# Altium footprint library RES_TH.PcbLib: 104 footprints (part 7 of 7)
Each footprint in its own frame and in the unit in brackets; x right, y up, seen from the top. Pads: shape width x height; smd on the part's side, far side on the other; paste and mask are expansions set on the pad; w line width, h text height; cw(c..) or ccw(c..) is an arc to the next point about the centre after c.
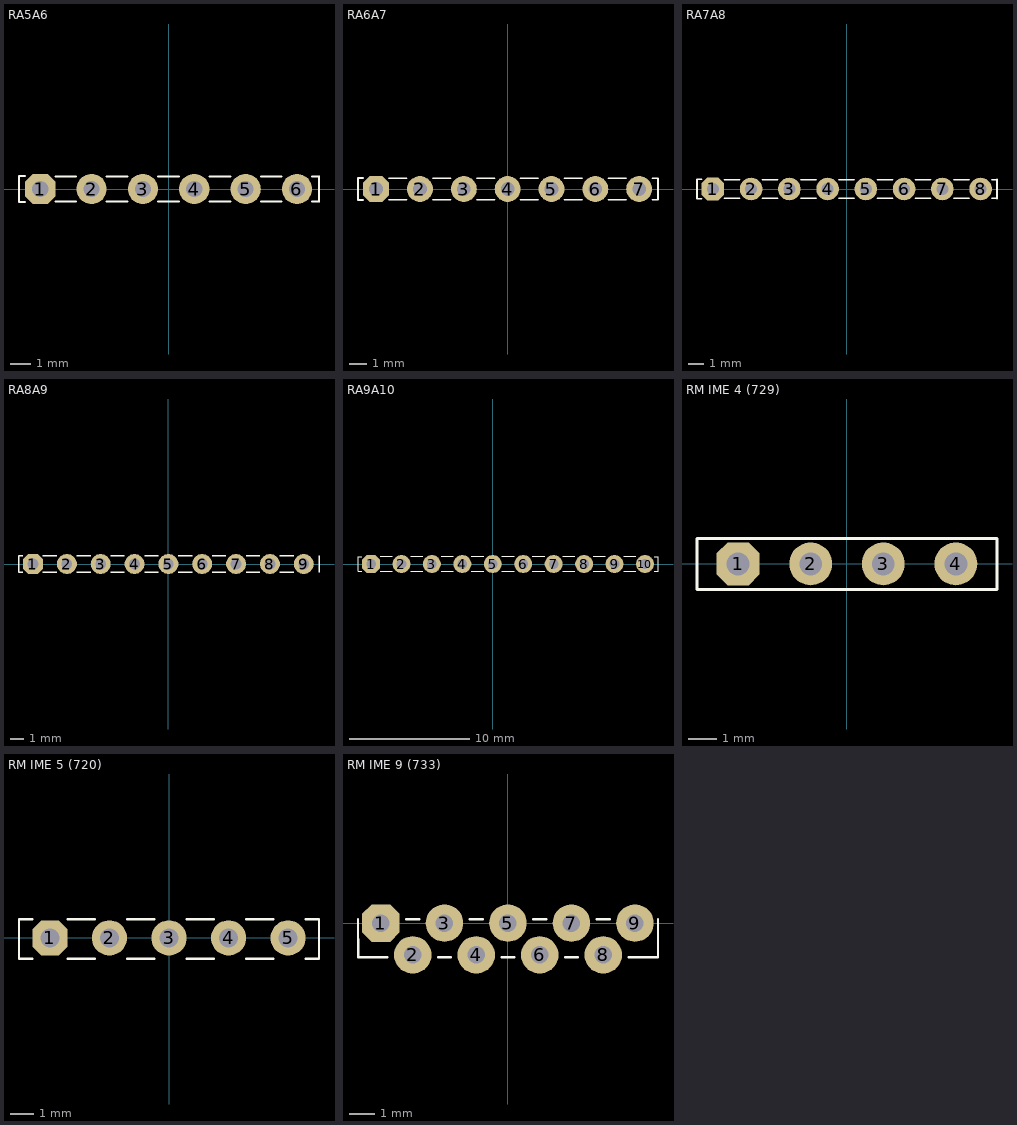
[diagram p6: the footprints below, top view; thin cyan lines are the x and y axes]

## RA5A6 [mm]
pads (6):
  oct 1.5x1.5 hole 0.8: 1(-6.35,0)
  round 1.5 hole 0.8: 2(-3.81,0) 3(-1.27,0) 4(1.27,0) 5(3.81,0) 6(6.35,0)
Top Overlay:
  lines w0.1: -7.1,-0.635 -7.4,-0.635 -7.4,0.635 -7.1,0.635 ; -5.6,-0.625 -4.57,-0.625 ; -5.6,0.625 -4.57,0.625 ; -3.06,-0.625 -2.03,-0.625 ; -3.06,0.625 -2.03,0.625 ; -0.52,-0.625 0.51,-0.625 ; -0.52,0.625 0.51,0.625 ; 2.02,-0.625 3.05,-0.625 ; 2.02,0.625 3.05,0.625 ; 4.56,-0.625 5.59,-0.625 ; 4.56,0.625 5.59,0.625 ; 7.1,-0.625 7.44,-0.625 ; 7.1,0.625 7.44,0.625 ; 7.44,-0.625 7.44,0.625 ; 7.44,-0.625 7.44,-0.625 ; 7.44,0.625 7.44,0.625
3D body "RM-6.SLDPRT": height 5.3, standoff -3.2, extent -7.4,-0.625 7.44,0.625

## RA6A7 [mm]
pads (7):
  oct 1.5x1.5 hole 0.8: 1(-7.62,0)
  round 1.5 hole 0.8: 2(-5.08,0) 3(-2.54,0) 4(0,0) 5(2.54,0) 6(5.08,0) 7(7.62,0)
Top Overlay:
  lines w0.1: -8.37,-0.635 -8.67,-0.635 -8.67,0.635 -8.37,0.635 ; -6.87,-0.625 -5.84,-0.625 ; -6.87,0.625 -5.84,0.625 ; -4.33,-0.625 -3.3,-0.625 ; -4.33,0.625 -3.3,0.625 ; -1.79,-0.625 -0.76,-0.625 ; -1.79,0.625 -0.76,0.625 ; 0.75,-0.625 1.78,-0.625 ; 0.75,0.625 1.78,0.625 ; 3.29,-0.625 4.32,-0.625 ; 3.29,0.625 4.32,0.625 ; 5.83,-0.625 6.86,-0.625 ; 5.83,0.625 6.86,0.625 ; 8.37,-0.625 8.71,-0.625 8.71,0.625 8.37,0.625
3D body "RM-7.SLDPRT": height 5.3, standoff -3.2, extent -8.67,-0.625 8.71,0.625

## RA7A8 [mm]
pads (8):
  oct 1.5x1.5 hole 0.8: 1(-8.89,0)
  round 1.5 hole 0.8: 2(-6.35,0) 3(-3.81,0) 4(-1.27,0) 5(1.27,0) 6(3.81,0) 7(6.35,0) 8(8.89,0)
Top Overlay:
  lines w0.1: -9.64,-0.635 -9.94,-0.635 -9.94,0.635 -9.64,0.635 ; -8.14,-0.625 -7.11,-0.625 ; -8.14,0.625 -7.11,0.625 ; -5.6,-0.625 -4.57,-0.625 ; -5.6,0.625 -4.57,0.625 ; -3.06,-0.625 -2.03,-0.625 ; -3.06,0.625 -2.03,0.625 ; -0.52,-0.625 0.51,-0.625 ; -0.52,0.625 0.51,0.625 ; 2.02,-0.625 3.05,-0.625 ; 2.02,0.625 3.05,0.625 ; 4.56,-0.625 5.59,-0.625 ; 4.56,0.625 5.59,0.625 ; 7.1,-0.625 8.13,-0.625 ; 7.1,0.625 8.13,0.625 ; 9.64,-0.625 9.98,-0.625 ; 9.64,0.625 9.98,0.625 ; 9.98,-0.635 9.98,0.635
3D body "RM-8.SLDPRT": height 6.3, standoff -2.2, extent -9.94,-0.625 9.98,0.625

## RA8A9 [mm]
pads (9):
  oct 1.5x1.5 hole 0.8: 1(-10.16,0)
  round 1.5 hole 0.8: 2(-7.62,0) 3(-5.08,0) 4(-2.54,0) 5(0,0) 6(2.54,0) 7(5.08,0) 8(7.62,0) 9(10.16,0)
Top Overlay:
  lines w0.1: -10.91,-0.635 -11.21,-0.635 -11.21,0.635 -10.91,0.635 ; -9.41,-0.625 -8.38,-0.625 ; -9.41,0.625 -8.38,0.625 ; -6.87,-0.625 -5.84,-0.625 ; -6.87,0.625 -5.84,0.625 ; -4.33,-0.625 -3.3,-0.625 ; -4.33,0.625 -3.3,0.625 ; -1.79,-0.625 -0.76,-0.625 ; -1.79,0.625 -0.76,0.625 ; 0.75,-0.625 1.78,-0.625 ; 0.75,0.625 1.78,0.625 ; 3.29,-0.625 4.32,-0.625 ; 3.29,0.625 4.32,0.625 ; 5.83,-0.625 6.86,-0.625 ; 5.83,0.625 6.86,0.625 ; 8.37,-0.625 9.4,-0.625 ; 8.37,0.625 9.4,0.625 ; 11.303,-0.635 11.303,0.635
3D body "RM-9.SLDPRT": height 6.3, standoff -2.2, extent -11.21,-0.625 11.25,0.625

## RA9A10 [mm]
pads (10):
  oct 1.5x1.5 hole 0.8: 1(-10.16,0)
  round 1.5 hole 0.8: 2(-7.62,0) 3(-5.08,0) 4(-2.54,0) 5(0,0) 6(2.54,0) 7(5.08,0) 8(7.62,0) 9(10.16,0) 10(12.7,0)
Top Overlay:
  lines w0.1: -10.922,-0.625 -11.25,-0.625 -11.25,0.625 -10.922,0.625 ; -9.398,-0.625 -8.382,-0.625 ; -9.398,0.635 -8.382,0.635 ; -6.858,-0.625 -5.842,-0.625 ; -6.858,0.635 -5.842,0.635 ; -4.318,-0.625 -3.302,-0.625 ; -4.318,0.635 -3.302,0.635 ; -1.778,-0.625 -0.762,-0.625 ; -1.778,0.635 -0.762,0.635 ; 0.762,-0.625 1.778,-0.625 ; 0.762,0.635 1.778,0.635 ; 3.302,-0.625 4.318,-0.625 ; 3.302,0.635 4.318,0.635 ; 5.842,-0.625 6.858,-0.625 ; 5.842,0.635 6.858,0.635 ; 8.382,-0.625 9.398,-0.625 ; 8.382,0.635 9.398,0.635 ; 10.922,-0.625 11.938,-0.625 ; 10.922,0.635 11.938,0.635 ; 13.462,-0.625 13.79,-0.625 13.79,0.625 13.462,0.625
3D body "RM-10.SLDPRT": height 6.3, standoff -2.2, extent -11.21,-0.625 13.79,0.625

## RM IME 4 (729) [mm]
pads (4):
  oct 1.5x1.5 hole 0.8: 1(-3.81,0)
  round 1.5 hole 0.8: 2(-1.27,0) 3(1.27,0) 4(3.81,0)
Top Overlay:
  lines w0.1: -5.25,-0.9 5.25,-0.9 5.25,0.889 -5.25,0.889 -5.25,-0.9
3D body "RM-4 (0729).SLDPRT": height 9.48, standoff -2.5, extent -5.25,-0.9 5.25,0.8

## RM IME 5 (720) [mm]
pads (5):
  oct 1.5x1.5 hole 0.8: 1(-5.08,0)
  round 1.5 hole 0.8: 2(-2.54,0) 3(0,0) 4(2.54,0) 5(5.08,0)
Top Overlay:
  lines w0.1: -5.83,-0.889 -6.4,-0.889 -6.4,0.8 -5.83,0.8 ; -4.318,-0.889 -3.175,-0.889 ; -4.318,0.8 -3.175,0.8 ; -1.778,-0.889 -0.635,-0.889 ; -1.778,0.8 -0.635,0.8 ; 0.762,-0.889 1.905,-0.889 ; 0.762,0.8 1.905,0.8 ; 3.302,-0.889 4.445,-0.889 ; 3.302,0.8 4.445,0.8 ; 5.83,-0.889 6.4,-0.889 6.4,0.8 5.83,0.8
3D body "RM-5 (0720).SLDPRT": height 10.62, standoff -2.5, extent -6.4,-0.9 6.4,0.8

## RM IME 9 (733) [mm]
pads (9):
  oct 1.5x1.5 hole 0.7: 1(-5.08,0)
  round 1.5 hole 0.7: 2(-3.81,-1.27) 3(-2.54,0) 4(-1.27,-1.27) 5(0,0) 6(1.27,-1.27) 7(2.54,0) 8(3.81,-1.27) 9(5.08,0)
Top Overlay:
  lines w0.1: -6,0.15 -6,-1.37 -4.826,-1.37 ; -4.064,0.15 -3.556,0.15 ; -2.794,-1.37 -2.286,-1.37 ; -1.524,0.15 -1.016,0.15 ; -0.254,-1.37 0.254,-1.37 ; 1.016,0.15 1.524,0.15 ; 2.286,-1.37 2.794,-1.37 ; 3.556,0.15 4.064,0.15 ; 4.826,-1.37 6,-1.37 6,0.15
3D body "RM-7 (0733).SLDPRT": height 13, standoff -2.5, extent -6,-1.37 6,0.15